# Altium footprint library mmyLibrary.PcbLib: 231 footprints (part 10 of 15)
Each footprint in its own frame and in the unit in brackets; x right, y up, seen from the top. Pads: shape width x height; smd on the part's side, far side on the other; paste and mask are expansions set on the pad; w line width, h text height; cw(c..) or ccw(c..) is an arc to the next point about the centre after c.
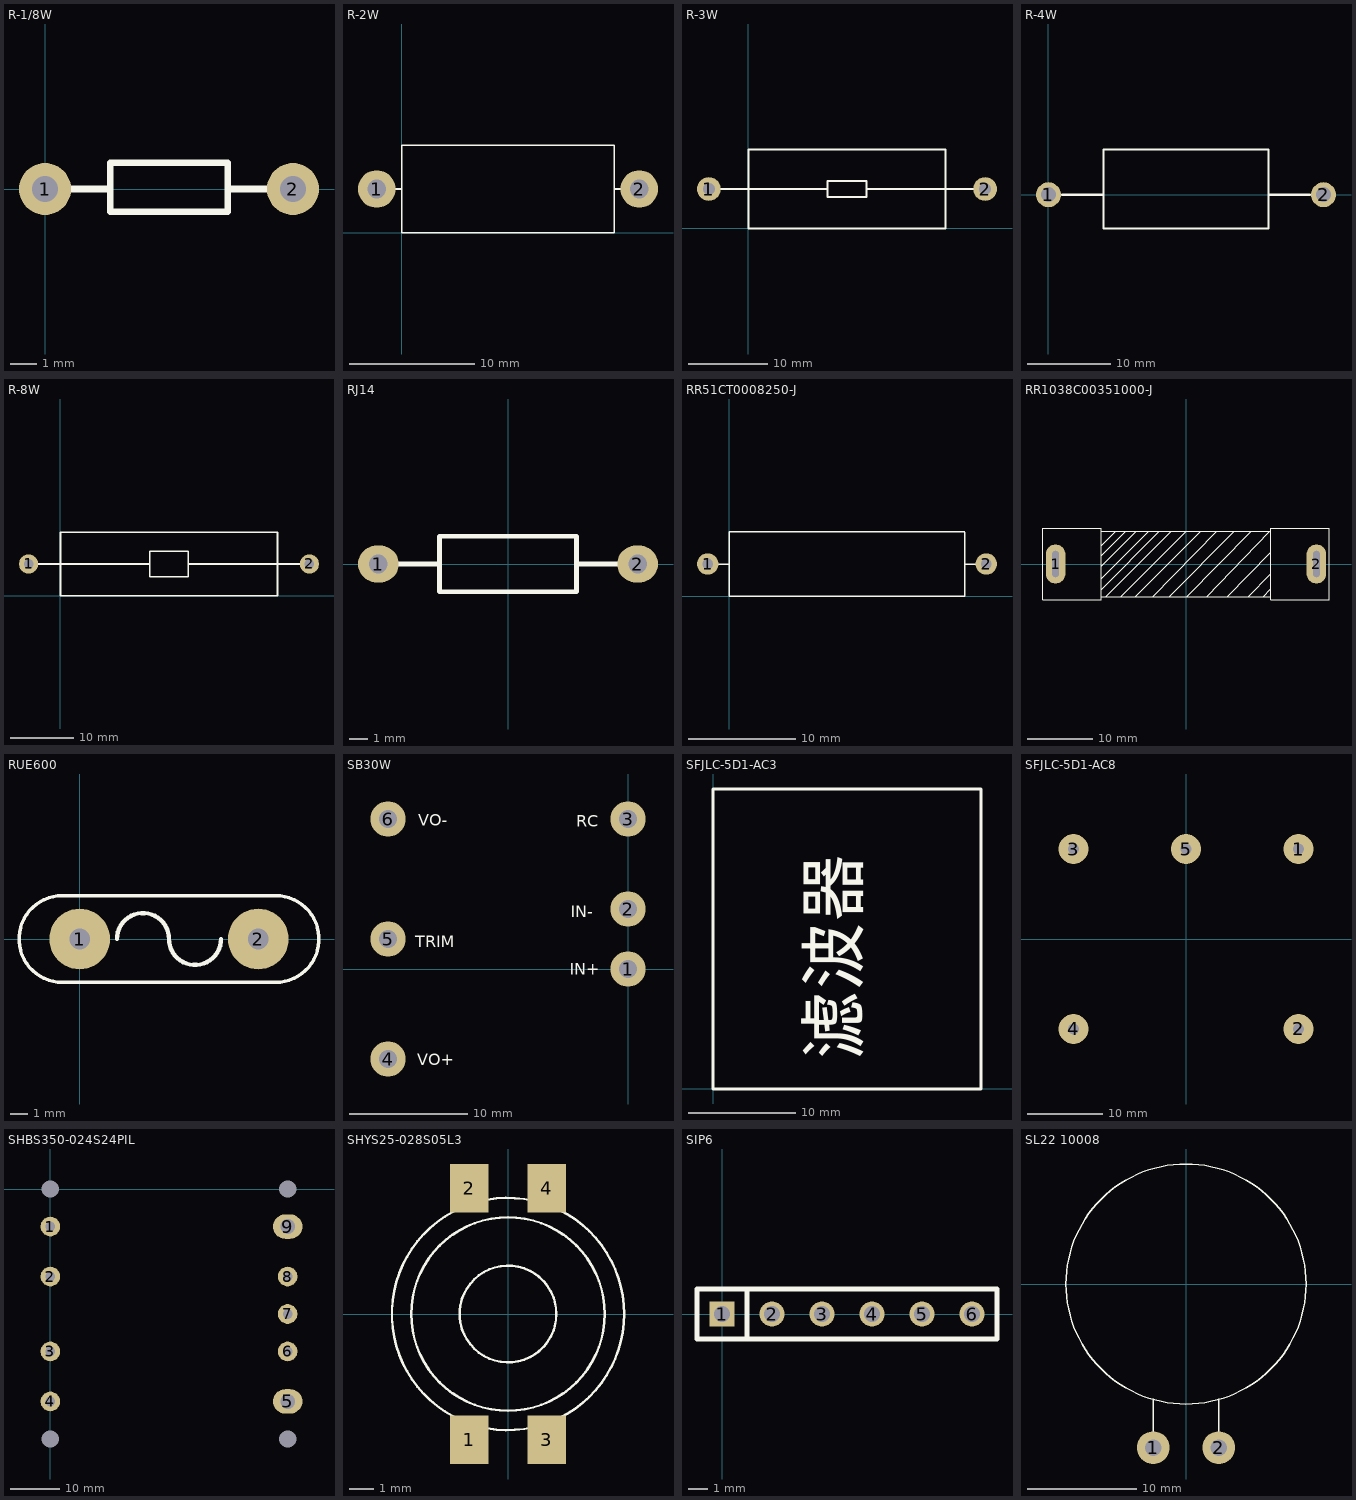
[diagram p9: the footprints below, top view; thin cyan lines are the x and y axes]

## R-1/8W [mm]
pads (2):
  round 2 hole 1: 1(0,0) 2(9.5,0)
Top Overlay:
  lines w0.254: 0,0 2.484,0 ; 7.016,0 9.5,0 ; 2.5,-0.873 7,-0.873 7,1 2.5,1 2.5,-0.873

## R-2W [mm]
pads (2):
  round 3 hole 1.5: 1(-2,3.5) 2(19,3.5)
Top Overlay:
  lines w0.127: -2,3.5 0,3.5 ; 17,3.5 19,3.5 ; 0,0 0,7 17,7 17,0 0,0

## R-3W [mm]
pads (2):
  round 3 hole 1.5: 1(-5,5) 2(30,5)
Top Overlay:
  lines w0.254: -5,5 -0.047,5 ; 0,5 10,5 ; 15,5 30,5 ; 0,0 25,0 25,10 0,10 0,0 ; 10,4 10,6 15,6 15,4 10,4

## R-4W [mm] "蚌埠康麟"
pads (2):
  round 3 hole 1.8: 1(0,0) 2(33.02,0)
Top Overlay:
  lines w0.254: 1.604,0 6.604,0 ; 26.416,0 31.416,0 ; 6.604,-4.064 6.604,5.436 26.416,5.436 26.416,-4.064 6.604,-4.064

## R-8W [mm]
pads (2):
  round 3 hole 1.5: 1(-5,5) 2(39,5)
Top Overlay:
  lines w0.254: -5,5 -0.047,5 ; 0,5 14,5 ; 20,5 34,5 ; 34.047,5 39,5 ; 0,0 34,0 34,10 0,10 0,0 ; 14,3 14,7 20,7 20,3 14,3

## RJ14 [mm]
pads (2):
  oval 2.2x2 hole 1: 1(-7,0) 2(7,0)
Top Overlay:
  lines w0.254: -7,0 -3.827,0 ; 3.7,0 7,0 ; -3.7,-1.5 3.7,-1.5 3.7,1.5 -3.7,1.5 -3.7,-1.5

## RR51CT0008250-J [mm]
pads (2):
  round 2 hole 1: 1(-2,3) 2(24,3)
Top Overlay:
  lines w0.127: -2,3 0,3 ; 22,3 24,3 ; 22,5.969 22,0 0,0 0,6 22,6

## RR1038C00351000-J [mm] "39MM*12.7MM"
height 12.7
pads (2):
  oval 3x6 hole 1 slot 4 at 90 deg: 1(-20,0) 2(20,0)
Top Overlay:
  lines w0.127: -13,-5 13,-5 ; -13,-3.937 -4.064,5 ; -13,-2.286 -5.715,5 ; -13,-0.381 -7.62,5 ; -13,1.27 -9.271,5 ; -13,2.794 -10.795,5 ; -13,5 13,5 ; -12.319,-5 -2.286,5 ; -10.033,-5 0,5 ; -7.747,-5 2.286,5 ; -5.08,-5 4.699,5 ; -2.54,-5 7.366,5 ; 0.127,-5 10.033,5 ; 3.175,-5 12.827,5 ; 6.35,-5 13,1.778 ; 9.525,-5 13,-1.524 ; 11.811,-5 13,-3.81 ; -22,-5.5 -22,5.5 -13,5.5 -13,-5.5 -22,-5.5 ; 13,-5.5 13,5.5 22,5.5 22,-5.5 13,-5.5

## RUE600 [mm] "RUE600/RUE500/RUE400"
pads (2):
  round 3.5 hole 1.2: 1(0,0) 2(10.3,0)
Top Overlay:
  lines w0.2: -1,-2.5 cw(c-1,0) -1,2.5 11.3,2.5 cw(c11.3,0) 11.3,-2.5 -1,-2.5
  lines w0.254: 2.15,0 cw(c3.65,0) 5.15,0 ccw(c6.65,0) 8.15,0

## SB30W [mm] "标准砖"
height 10.2
pads (6):
  round 3 hole 1.5: 1(0,0) 2(0,5.08) 3(0,12.7) 4(-20.32,-7.62) 5(-20.32,2.54) 6(-20.32,12.7)
Top Overlay:
  text "VO+" at -17.856,-8.153 h1
  text "VO-" at -17.755,12.141 h1
  text "TRIM" at -18.034,1.854 h1
  text "RC" at -4.394,12.04 h1
  text "IN-" at -4.851,4.369 h1
  text "IN+" at -4.953,-0.483 h1
Bottom Overlay:
  lines w0.254: -22.86,-10.16 2.54,-10.16 2.54,15.24 -22.86,15.24 -22.86,-10.16

## SFJLC-5D1-AC3 [mm] "滤波器：L39mm*W34mm*H15.5mm 新欣神风"
height 15.5
Top Overlay:
  lines w0.254: 0,0 25,0 25,28 0,28 0,0
  text "滤波器" at 14.986,2.794 h8

## SFJLC-5D1-AC8 [mm]
height 15.5
pads (5):
  round 4 hole 1.5: 1(15,12) 2(15,-12) 3(-15,12) 4(-15,-12) 5(0,12)
Bottom Overlay:
  lines w0.127: -20,15.93 cw(c-18.73,15.93) -18.73,17.2 -17.272,17.2 ; -20,15.941 -20,-15.93 ccw(c-18.73,-15.93) -18.73,-17.2 -16.637,-17.2 ; -18.741,17.2 18.868,17.2 ; -18.614,-17.2 18.741,-17.2 ; 17.907,17.2 18.73,17.2 cw(c18.73,15.93) 20,15.93 ; 18.73,-17.2 ccw(c18.73,-15.93) 20,-15.93 20,-13.589 ; 20,-15.941 20,16.068
  text "SFJLC-5D1-AC8" at -10.287,0.889 h3

## SHBS350-024S24PIL [mm] "皓文/半砖模块"
height 12.7
pads (13):
  round 0 hole 3.5: 0(0,-50.8) 0(0,0) 0(48.26,-50.8) 0(48.26,0)
  round 4 hole 2: 1(0,-7.62) 2(0,-17.78) 3(0,-33.02) 4(0,-43.18) 6(48.26,-33.02) 7(48.26,-25.4) 8(48.26,-17.78)
  oval 6x5 hole 3: 5(48.26,-43.18) 9(48.26,-7.62)
Bottom Overlay:
  lines w0.254: -4.82,-55.9 53.08,-55.9 53.08,5.1 -4.82,5.1 -4.82,-55.9
  text "-VOUT" at 35.941,-8.509 h3
  text "-S" at 41.783,-18.669 h3
  text "TRIM" at 38.1,-26.416 h3
  text "+S" at 41.148,-33.782 h3
  text "+VOUT" at 35.433,-44.196 h3
  text "+VIN" at 2.921,-44.196 h3
  text "RC" at 2.921,-33.909 h3
  text "CASE" at 2.667,-18.542 h3
  text "-VIN" at 2.794,-8.509 h3
  text "1" at -3.81,-8.509 h3
  text "2" at -3.81,-18.796 h3
  text "3" at -3.937,-33.909 h3
  text "4" at -3.937,-44.196 h3
  text "5" at 51.689,-43.942 h3
  text "6" at 51.054,-33.782 h3
  text "7" at 51.054,-26.416 h3
  text "8" at 51.054,-18.669 h3
  text "9" at 51.562,-8.509 h3

## SHYS25-028S05L3 [mm]
pads (4):
  rect 1.6x2 smd: 1(-1.6,-5.2) 2(-1.6,5.2) 3(1.6,-5.2) 4(1.6,5.2)
Top Overlay:
  circle w0.1: c0,0 r4
  circle w0.1: c0,0 r2
  circle w0.1: c0,0 r4.8

## SIP6 [mil]
pads (6):
  rect 50x50 hole 32: 1(0,0)
  round 50 hole 32: 2(100,0) 3(200,0) 4(300,0) 5(400,0) 6(500,0)
Top Overlay:
  lines w10: 50,-50 50,50 ; -50,-50 550,-50 550,50 -50,50 -50,-50

## SL22 10008 [mm]
pads (2):
  round 3 hole 1.5: 1(-3,-15) 2(3,-15)
Top Overlay:
  circle w0.127: c0,0 r11
  lines w0.127: -2.984,-15 -2.984,-10.541 ; 2.984,-15 2.984,-10.541